# Altium footprint library IC.PcbLib: 115 footprints (part 3 of 8)
Each footprint in its own frame and in the unit in brackets; x right, y up, seen from the top. Pads: shape width x height; smd on the part's side, far side on the other; paste and mask are expansions set on the pad; w line width, h text height; cw(c..) or ccw(c..) is an arc to the next point about the centre after c.
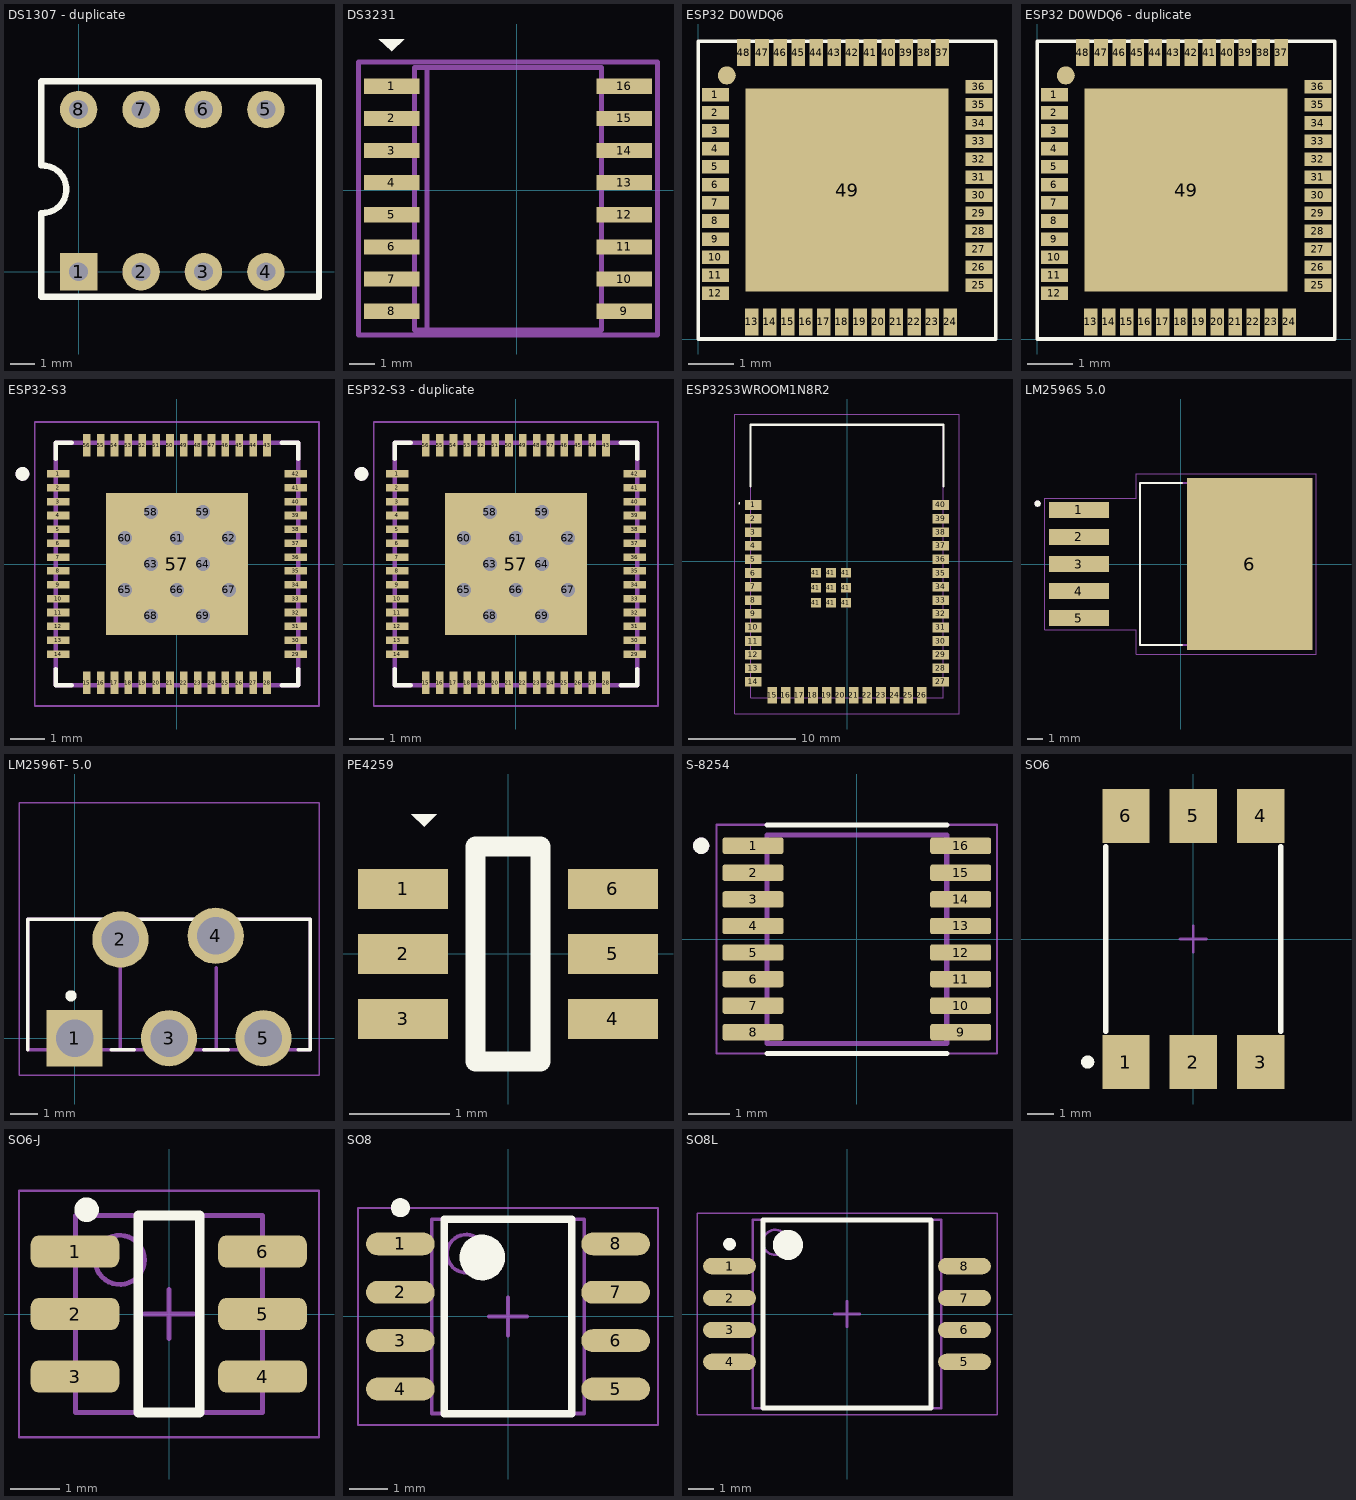
[diagram p2: the footprints below, top view; thin cyan lines are the x and y axes]

## DS1307 - duplicate [mil] "DS1307RTC"
pads (8):
  rect 60x60 hole 30: 1(0,0)
  round 60 hole 30: 2(100,0) 3(200,0) 4(300,0) 5(300,259.84) 6(200,259.84) 7(100,259.84) 8(0,259.84)
Top Overlay:
  lines w10: -60,-40 385,-40 385,305 -60,305 -60,170 cw(c-57.47,132.12) -60,94.24 -60,-40

## DS3231 [mm] "DIP16"
pads (16):
  rect 2.2x0.6 smd: 1(-4.956,4.115) 2(-4.956,2.845) 3(-4.956,1.575) 4(-4.956,0.305) 5(-4.956,-0.965) 6(-4.956,-2.235) 7(-4.956,-3.505) 8(-4.956,-4.775) 9(4.244,-4.775) 10(4.244,-3.505) 11(4.244,-2.235) 12(4.244,-0.965) 13(4.244,0.305) 14(4.244,1.575) 15(4.244,2.845) 16(4.244,4.115)
Top Overlay:
  region: -5.474,5.982 -4.458,5.982 -4.94,5.499
Mechanical 13:
  region: 3.444,3.87 3.444,4.36 4.964,4.36 4.964,3.87
  region: 3.444,2.6 3.444,3.09 4.964,3.09 4.964,2.6
  region: 3.444,1.33 3.444,1.82 4.964,1.82 4.964,1.33
  region: 3.444,0.06 3.444,0.55 4.964,0.55 4.964,0.06
  region: 3.444,-1.21 3.444,-0.72 4.964,-0.72 4.964,-1.21
  region: 3.444,-2.48 3.444,-1.99 4.964,-1.99 4.964,-2.48
  region: 3.444,-3.75 3.444,-3.26 4.964,-3.26 4.964,-3.75
  region: 3.444,-5.02 3.444,-4.53 4.964,-4.53 4.964,-5.02
  region: -5.676,-5.02 -5.676,-4.53 -4.156,-4.53 -4.156,-5.02
  region: -5.676,-3.75 -5.676,-3.26 -4.156,-3.26 -4.156,-3.75
  region: -5.676,-2.48 -5.676,-1.99 -4.156,-1.99 -4.156,-2.48
  region: -5.676,-1.21 -5.676,-0.72 -4.156,-0.72 -4.156,-1.21
  region: -5.676,0.06 -5.676,0.55 -4.156,0.55 -4.156,0.06
  region: -5.676,1.33 -5.676,1.82 -4.156,1.82 -4.156,1.33
  region: -5.676,2.6 -5.676,3.09 -4.156,3.09 -4.156,2.6
  region: -5.676,3.87 -5.676,4.36 -4.156,4.36 -4.156,3.87
  lines w0.203: -3.556,-5.52 -4.056,-5.52 -4.056,4.86 -3.556,4.86 ; -3.556,-5.52 3.344,-5.52 3.344,4.86 -3.556,4.86 ; -3.556,-5.52 -3.556,4.86
Mechanical 15:
  lines w0.2: -6.256,-5.725 5.544,-5.725 5.544,5.065 -6.256,5.065 -6.256,-5.725
3D body "step_temp.STEP": height 2.65, standoff 0, extent -5.518,-5.48 4.807,4.82

## ESP32 D0WDQ6 [mm] "ESP32 D0WDQ6"
pads (50):
  rect 0.6x0.3 smd mask+0: 1(0.381,5.416) 2(0.381,5.016) 3(0.381,4.616) 4(0.381,4.216) 5(0.381,3.816) 6(0.381,3.416) 7(0.381,3.016) 8(0.381,2.616) 9(0.381,2.216) 10(0.381,1.816) 11(0.381,1.416) 12(0.381,1.016) 25(6.223,1.188) 26(6.223,1.588) 27(6.223,1.988) 28(6.223,2.388) 29(6.223,2.788) 30(6.223,3.188) 31(6.223,3.588) 32(6.223,3.988) 33(6.223,4.388) 34(6.223,4.788) 35(6.223,5.188) 36(6.223,5.588)
  rect 0.3x0.6 smd mask+0: 13(1.188,0.381) 14(1.588,0.381) 15(1.988,0.381) 16(2.388,0.381) 17(2.788,0.381) 18(3.188,0.381) 19(3.588,0.381) 20(3.988,0.381) 21(4.388,0.381) 22(4.788,0.381) 23(5.188,0.381) 24(5.588,0.381) 37(5.416,6.35) 38(5.016,6.35) 39(4.616,6.35) 40(4.216,6.35) 41(3.816,6.35) 42(3.416,6.35) 43(3.016,6.35) 44(2.616,6.35) 45(2.216,6.35) 46(1.816,6.35) 47(1.416,6.35) 48(1.016,6.35)
  rect 4.5x4.5 smd mask+0: 49(3.302,3.302)
  round 0.4 smd mask+0: ""(0.635,5.842)
Top Overlay:
  lines w0.08: 0,0 6.6,0 6.6,6.6 0,6.6 0,0
3D body "ESP32-D0WDQ6-V3_EXP.step": height 0.89, standoff 0, extent 0.279,0.279 6.325,6.325

## ESP32 D0WDQ6 - duplicate [mm] "ESP32 D0WDQ6"
pads (50):
  rect 0.6x0.3 smd mask+0: 1(0.381,5.416) 2(0.381,5.016) 3(0.381,4.616) 4(0.381,4.216) 5(0.381,3.816) 6(0.381,3.416) 7(0.381,3.016) 8(0.381,2.616) 9(0.381,2.216) 10(0.381,1.816) 11(0.381,1.416) 12(0.381,1.016) 25(6.223,1.188) 26(6.223,1.588) 27(6.223,1.988) 28(6.223,2.388) 29(6.223,2.788) 30(6.223,3.188) 31(6.223,3.588) 32(6.223,3.988) 33(6.223,4.388) 34(6.223,4.788) 35(6.223,5.188) 36(6.223,5.588)
  rect 0.3x0.6 smd mask+0: 13(1.188,0.381) 14(1.588,0.381) 15(1.988,0.381) 16(2.388,0.381) 17(2.788,0.381) 18(3.188,0.381) 19(3.588,0.381) 20(3.988,0.381) 21(4.388,0.381) 22(4.788,0.381) 23(5.188,0.381) 24(5.588,0.381) 37(5.416,6.35) 38(5.016,6.35) 39(4.616,6.35) 40(4.216,6.35) 41(3.816,6.35) 42(3.416,6.35) 43(3.016,6.35) 44(2.616,6.35) 45(2.216,6.35) 46(1.816,6.35) 47(1.416,6.35) 48(1.016,6.35)
  rect 4.5x4.5 smd mask+0: 49(3.302,3.302)
  round 0.4 smd mask+0: ""(0.635,5.842)
Top Overlay:
  lines w0.08: 0,0 6.6,0 6.6,6.6 0,6.6 0,0
3D body "ESP32-D0WDQ6-V3_EXP.step": height 0.89, standoff 0, extent 0.279,0.279 6.325,6.325

## ESP32-S3 [mm]
height 0.9
pads (69):
  rect 0.65x0.22 smd mask+0.05: 1(-3.425,2.6) 2(-3.425,2.2) 3(-3.425,1.8) 4(-3.425,1.4) 5(-3.425,1) 6(-3.425,0.6) 7(-3.425,0.2) 8(-3.425,-0.2) 9(-3.425,-0.6) 10(-3.425,-1) 11(-3.425,-1.4) 12(-3.425,-1.8) 13(-3.425,-2.2) 14(-3.425,-2.6) 29(3.425,-2.6) 30(3.425,-2.2) 31(3.425,-1.8) 32(3.425,-1.4) 33(3.425,-1) 34(3.425,-0.6) 35(3.425,-0.2) 36(3.425,0.2) 37(3.425,0.6) 38(3.425,1) 39(3.425,1.4) 40(3.425,1.8) 41(3.425,2.2) 42(3.425,2.6)
  rect 0.22x0.65 smd mask+0.05: 15(-2.6,-3.425) 16(-2.2,-3.425) 17(-1.8,-3.425) 18(-1.4,-3.425) 19(-1,-3.425) 20(-0.6,-3.425) 21(-0.2,-3.425) 22(0.2,-3.425) 23(0.6,-3.425) 24(1,-3.425) 25(1.4,-3.425) 26(1.8,-3.425) 27(2.2,-3.425) 28(2.6,-3.425) 43(2.6,3.425) 44(2.2,3.425) 45(1.8,3.425) 46(1.4,3.425) 47(1,3.425) 48(0.6,3.425) 49(0.2,3.425) 50(-0.2,3.425) 51(-0.6,3.425) 52(-1,3.425) 53(-1.4,3.425) 54(-1.8,3.425) 55(-2.2,3.425) 56(-2.6,3.425)
  rect 4.1x4.1 smd paste-1.55: 57(0,0)
  round 0.5 hole 0.4 mask+0: 58(-0.75,1.5) 59(0.75,1.5) 60(-1.5,0.75) 61(0,0.75) 62(1.5,0.75) 63(-0.75,0) 64(0.75,0) 65(-1.5,-0.75) 66(0,-0.75) 67(1.5,-0.75) 68(-0.75,-1.5) 69(0.75,-1.5)
Top Overlay:
  circle w0.2: c-4.455,2.6 r0.1
  lines w0.127: -3.5,-3.03 -3.5,-3.5 -3.03,-3.5 ; -3.5,3.03 -3.5,3.5 -3.03,3.5 ; 3.03,-3.5 3.5,-3.5 3.5,-3.03 ; 3.03,3.5 3.5,3.5 3.5,3.03
Top Paste:
  region: -1,1 -2,1 -2,2 -1,2
  region: -1,-0.5 -2,-0.5 -2,0.5 -1,0.5
  region: -1,-2 -2,-2 -2,-1 -1,-1
  region: 0.5,-2 -0.5,-2 -0.5,-1 0.5,-1
  region: 2,-2 1,-2 1,-1 2,-1
  region: 2,-0.5 1,-0.5 1,0.5 2,0.5
  region: 2,1 1,1 1,2 2,2
  region: 0.5,1 -0.5,1 -0.5,2 0.5,2
Mechanical 13:
  circle w0.2: c-4.455,2.6 r0.1
  lines w0.127: -3.5,-3.5 -3.5,3.5 3.5,3.5 3.5,-3.5 -3.5,-3.5
Mechanical 15:
  lines w0.05: -4.1,-4.1 -4.1,4.1 4.1,4.1 4.1,-4.1 -4.1,-4.1
3D body "step_temp.STEP": height 0.9, standoff 0, extent -3.5,-3.5 3.5,3.5

## ESP32-S3 - duplicate [mm]
height 0.9
pads (69):
  rect 0.65x0.22 smd mask+0.05: 1(-3.425,2.6) 2(-3.425,2.2) 3(-3.425,1.8) 4(-3.425,1.4) 5(-3.425,1) 6(-3.425,0.6) 7(-3.425,0.2) 8(-3.425,-0.2) 9(-3.425,-0.6) 10(-3.425,-1) 11(-3.425,-1.4) 12(-3.425,-1.8) 13(-3.425,-2.2) 14(-3.425,-2.6) 29(3.425,-2.6) 30(3.425,-2.2) 31(3.425,-1.8) 32(3.425,-1.4) 33(3.425,-1) 34(3.425,-0.6) 35(3.425,-0.2) 36(3.425,0.2) 37(3.425,0.6) 38(3.425,1) 39(3.425,1.4) 40(3.425,1.8) 41(3.425,2.2) 42(3.425,2.6)
  rect 0.22x0.65 smd mask+0.05: 15(-2.6,-3.425) 16(-2.2,-3.425) 17(-1.8,-3.425) 18(-1.4,-3.425) 19(-1,-3.425) 20(-0.6,-3.425) 21(-0.2,-3.425) 22(0.2,-3.425) 23(0.6,-3.425) 24(1,-3.425) 25(1.4,-3.425) 26(1.8,-3.425) 27(2.2,-3.425) 28(2.6,-3.425) 43(2.6,3.425) 44(2.2,3.425) 45(1.8,3.425) 46(1.4,3.425) 47(1,3.425) 48(0.6,3.425) 49(0.2,3.425) 50(-0.2,3.425) 51(-0.6,3.425) 52(-1,3.425) 53(-1.4,3.425) 54(-1.8,3.425) 55(-2.2,3.425) 56(-2.6,3.425)
  rect 4.1x4.1 smd paste-1.55: 57(0,0)
  round 0.5 hole 0.4 mask+0: 58(-0.75,1.5) 59(0.75,1.5) 60(-1.5,0.75) 61(0,0.75) 62(1.5,0.75) 63(-0.75,0) 64(0.75,0) 65(-1.5,-0.75) 66(0,-0.75) 67(1.5,-0.75) 68(-0.75,-1.5) 69(0.75,-1.5)
Top Overlay:
  circle w0.2: c-4.455,2.6 r0.1
  lines w0.127: -3.5,-3.03 -3.5,-3.5 -3.03,-3.5 ; -3.5,3.03 -3.5,3.5 -3.03,3.5 ; 3.03,-3.5 3.5,-3.5 3.5,-3.03 ; 3.03,3.5 3.5,3.5 3.5,3.03
Top Paste:
  region: 0.5,1 -0.5,1 -0.5,2 0.5,2
  region: 2,1 1,1 1,2 2,2
  region: 2,-0.5 1,-0.5 1,0.5 2,0.5
  region: 2,-2 1,-2 1,-1 2,-1
  region: 0.5,-2 -0.5,-2 -0.5,-1 0.5,-1
  region: -1,-2 -2,-2 -2,-1 -1,-1
  region: -1,-0.5 -2,-0.5 -2,0.5 -1,0.5
  region: -1,1 -2,1 -2,2 -1,2
Mechanical 13:
  circle w0.2: c-4.455,2.6 r0.1
  lines w0.127: -3.5,-3.5 3.5,-3.5 3.5,3.5 -3.5,3.5 -3.5,-3.5
Mechanical 15:
  lines w0.05: -4.1,-4.1 4.1,-4.1 4.1,4.1 -4.1,4.1 -4.1,-4.1
3D body "step_temp.STEP": height 0.9, standoff 0, extent -3.5,-3.5 3.5,3.5

## ESP32S3WROOM1N8R2 [mm]
pads (49):
  rect 1.5x0.9 smd: 1(-8.75,5.26) 2(-8.75,3.99) 3(-8.75,2.72) 4(-8.75,1.45) 5(-8.75,0.18) 6(-8.75,-1.09) 7(-8.75,-2.36) 8(-8.75,-3.63) 9(-8.75,-4.9) 10(-8.75,-6.17) 11(-8.75,-7.44) 12(-8.75,-8.71) 13(-8.75,-9.98) 14(-8.75,-11.25) 27(8.75,-11.25) 28(8.75,-9.98) 29(8.75,-8.71) 30(8.75,-7.44) 31(8.75,-6.17) 32(8.75,-4.9) 33(8.75,-3.63) 34(8.75,-2.36) 35(8.75,-1.09) 36(8.75,0.18) 37(8.75,1.45) 38(8.75,2.72) 39(8.75,3.99) 40(8.75,5.26)
  rect 0.9x1.5 smd: 15(-6.985,-12.5) 16(-5.715,-12.5) 17(-4.445,-12.5) 18(-3.175,-12.5) 19(-1.905,-12.5) 20(-0.635,-12.5) 21(0.635,-12.5) 22(1.905,-12.5) 23(3.175,-12.5) 24(4.445,-12.5) 25(5.715,-12.5) 26(6.985,-12.5)
  rect 0.9x0.9 smd: 41(-2.9,-3.86) 41(-2.9,-2.46) 41(-2.9,-1.06) 41(-1.5,-3.86) 41(-1.5,-2.46) 41(-1.5,-1.06) 41(-0.1,-3.86) 41(-0.1,-2.46) 41(-0.1,-1.06)
Top Overlay:
  lines w0.1: -10.1,5.4 ccw(c-10.05,5.4) -10,5.4 ccw(c-10.05,5.4) -10.1,5.4
  lines w0.2: -9,7 -9,12.75 9,12.75 9,7
Mechanical 13:
  lines w0.1: -10.5,-14.25 -10.5,13.75 10.5,13.75 10.5,-14.25 -10.5,-14.25 ; -9,-12.75 -9,12.75 9,12.75 9,-12.75 -9,-12.75
3D body "step_temp.STEP": height 3.25, standoff 0, extent -9,-12.75 9,12.75

## LM2596S 5.0 [mm]
height 4.83
pads (6):
  rect 3.79x0.99 smd: 1(-6.4,3.4) 2(-6.4,1.7) 3(-6.4,0) 4(-6.4,-1.7) 5(-6.4,-3.4)
  rect 7.88x10.84 smd paste-6: 6(4.35,0)
Top Overlay:
  circle w0.2: c-9,3.8 r0.1
  lines w0.127: 0.09,-5.08 -2.553,-5.08 -2.553,5.08 0.09,5.08
Top Paste:
  region: 7.74,-5.15 6.22,-5.15 6.22,-3.9 7.74,-3.9
  region: 2.48,-5.15 0.96,-5.15 0.96,-3.9 2.48,-3.9
  region: 5.11,-5.15 3.59,-5.15 3.59,-3.9 5.11,-3.9
  region: 7.74,-3.34 6.22,-3.34 6.22,-2.09 7.74,-2.09
  region: 2.48,-3.34 0.96,-3.34 0.96,-2.09 2.48,-2.09
  region: 5.11,-3.34 3.59,-3.34 3.59,-2.09 5.11,-2.09
  region: 7.74,-1.53 6.22,-1.53 6.22,-0.28 7.74,-0.28
  region: 2.48,-1.53 0.96,-1.53 0.96,-0.28 2.48,-0.28
  region: 5.11,-1.53 3.59,-1.53 3.59,-0.28 5.11,-0.28
  region: 7.74,3.9 6.22,3.9 6.22,5.15 7.74,5.15
  region: 2.48,3.9 0.96,3.9 0.96,5.15 2.48,5.15
  region: 5.11,3.9 3.59,3.9 3.59,5.15 5.11,5.15
  region: 7.74,2.09 6.22,2.09 6.22,3.34 7.74,3.34
  region: 2.48,2.09 0.96,2.09 0.96,3.34 2.48,3.34
  region: 5.11,2.09 3.59,2.09 3.59,3.34 5.11,3.34
  region: 7.74,0.28 6.22,0.28 6.22,1.53 7.74,1.53
  region: 2.48,0.28 0.96,0.28 0.96,1.53 2.48,1.53
  region: 5.11,0.28 3.59,0.28 3.59,1.53 5.11,1.53
Mechanical 13:
  circle w0.2: c-9,3.8 r0.1
  lines w0.127: -2.553,-5.08 -2.553,5.08 6.368,5.08 6.368,-5.08 -2.553,-5.08
Mechanical 15:
  lines w0.05: -8.545,-4.145 -2.803,-4.145 -2.803,-5.67 8.54,-5.67 8.54,5.67 -2.803,5.67 -2.803,4.145 -8.545,4.145 -8.545,-4.145
3D body "step_temp.STEP": height 4.65, standoff -0.15, extent -7.175,-5.08 7.175,5.08

## LM2596T- 5.0 [mm] "SIMPLE SWITCHER® 4.5V to 40V, 3A Low Component Count Step-Down Regulator 5-TO-220"
pads (5):
  rect 2.025x2.025 / inner round 2.025 / far side rect 2.025x2.025 hole 1.35: 1(0,0)
  round 2.025 hole 1.35: 2(1.651,3.556) 3(3.4,0) 4(5.08,3.683) 5(6.8,0)
Top Overlay:
  circle w0.2: c-0.127,1.524 r0.1
  lines w0.127: -1.68,-0.42 -1.68,4.28 8.48,4.28 8.48,-0.42 8.06,-0.42 ; 1.329,-0.42 2.14,-0.42 ; 4.66,-0.42 5.54,-0.42
Mechanical 13:
  lines w0.127: 1.651,2.54 1.651,-0.42 5.1,-0.42 ; 1.7,-0.42 -1.68,-0.42 -1.68,4.28 8.48,4.28 8.48,-0.42 5.1,-0.42 ; 5.1,2.54 5.1,-0.42
Mechanical 15:
  lines w0.05: -2,-1.331 8.8,-1.331 8.8,8.47 -2,8.47 -2,-1.331
3D body "step_temp.STEP": height 20.93, standoff -3.78, extent -1.778,-0.089 8.382,8.382

## PCBComponent_1 [mm]

## PE4259 [mm] "RF Switch"
pads (6):
  rect 0.9x0.4 smd: 1(-1.05,0.65) 2(-1.05,0) 3(-1.05,-0.65) 4(1.05,-0.65) 5(1.05,0) 6(1.05,0.65)
Top Overlay:
  region: -0.965,1.397 -0.711,1.397 -0.838,1.27
  lines w0.2: -0.325,-1.075 0.325,-1.075 0.325,1.075 -0.325,1.075 -0.325,-1.075
3D body "PE4259.STEP": height 1.1, standoff 0, extent -1.05,-1.05 1.05,1.05

## S-8254 [mm]
height 1.1
pads (16):
  rrect25% 1.49x0.4 smd: 1(-2.54,2.286) 2(-2.54,1.625) 3(-2.54,0.975) 4(-2.54,0.325) 5(-2.54,-0.325) 6(-2.54,-0.975) 7(-2.54,-1.625) 8(-2.54,-2.275) 9(2.54,-2.275) 10(2.54,-1.625) 11(2.54,-0.975) 12(2.54,-0.325) 13(2.54,0.325) 14(2.54,0.975) 15(2.54,1.625) 16(2.54,2.286)
Top Overlay:
  circle w0.2: c-3.81,2.286 r0.1
  lines w0.127: -2.2,-2.795 2.2,-2.795 ; -2.2,2.795 2.2,2.795
Mechanical 13:
  circle w0.2: c-3.81,2.286 r0.1
  lines w0.127: -2.2,-2.55 -2.2,2.55 2.2,2.55 2.2,-2.55 -2.2,-2.55
Mechanical 15:
  lines w0.05: -3.429,-2.8 -3.429,2.8 3.429,2.8 3.429,-2.8 -3.429,-2.8
3D body "step_temp.STEP": height 1.1, standoff 0, extent -3.2,-2.55 3.2,2.55

## SO6 [mil]
height 200
pads (6):
  rect 70x80 smd: 1(-100,-182.48) 2(0,-182.48) 3(100,-182.48) 5(0,182.48) 6(-100,182.48)
  rect 70x80 smd mask+0: 4(100,182.48)
Top Overlay:
  circle w9.84: c-156.69,-182.48 r4.92
  lines w7.87: -129.92,-136.81 -129.92,136.81 ; 129.92,-136.81 129.92,136.81
Mechanical 15:
  lines w3.94: -19.69,0 19.68,0 ; 0,-19.68 0,19.68
3D body "PC900.stp": height 140.63, standoff 0.14, extent -138.06,-212.03 138.5,211.43

## SO6-J [mm] "SOJ, 6-Leads, Body 4.00x4.30mm, Pitch 1.27mm, IPC Low Density"
height 1.1
pads (6):
  rrect50% 1.8x0.65 smd: 1(-1.91,1.27) 2(-1.91,0) 3(-1.91,-1.27) 4(1.9,-1.27) 5(1.9,0) 6(1.9,1.27)
Top Overlay:
  circle w0.25: c-1.675,2.12 r0.125
  lines w0.2: -0.625,-2 0.625,-2 0.625,2 -0.625,2 -0.625,-2
Mechanical 13:
  circle w0.1: c-1,1.1 r0.5
  lines w0.1: -1.9,-2 1.9,-2 1.9,2 -1.9,2 -1.9,-2
Mechanical 15:
  lines w0.05: -3.048,-2.5 3.048,-2.5 3.048,2.5 -3.048,2.5 -3.048,-2.5
  lines w0.1: -0.5,0 0.5,0 ; 0,-0.5 0,0.5
3D body "SOIC127P490X150-6N.step": height 1.5, standoff 0, extent -2.45,-2 2.45,2

## SO8 [mm] "SOIC, 8-Leads, Body 4.9x3.9mm, Pitch 1.27mm, IPC High Density"
pads (8):
  oval 1.8x0.6 smd: 1(-2.825,1.905) 2(-2.825,0.635) 3(-2.825,-0.635) 4(-2.825,-1.905) 5(2.825,-1.905) 6(2.825,-0.635) 7(2.825,0.635) 8(2.825,1.905)
Top Overlay:
  circle w0.6: c-0.675,1.55 r0.3
  circle w0.25: c-2.825,2.855 r0.125
  lines w0.2: -1.675,-2.55 1.675,-2.55 1.675,2.55 -1.675,2.55 -1.675,-2.55
Mechanical 13:
  circle w0.1: c-1.1,1.65 r0.5
  lines w0.1: -2,-2.55 2,-2.55 2,2.55 -2,2.55 -2,-2.55
Mechanical 15:
  lines w0.05: -3.937,-2.85 3.937,-2.85 3.937,2.85 -3.937,2.85 -3.937,-2.85
  lines w0.1: -0.5,0 0.5,0 ; 0,-0.5 0,0.5
3D body "CircuitWorks-SO-8 (PIC12FXXX).step": height 1.6, standoff 0, extent -2.995,-2.45 2.995,2.45

## SO8L [mm] "SOIC, 8-Leads, Body 7.50x7.50mm, Pitch 1.27mm, IPC Medium Density"
height 1.5
pads (8):
  oval 2.1x0.65 smd: 1(-4.675,1.905) 2(-4.675,0.635) 3(-4.675,-0.635) 4(-4.675,-1.905) 5(4.675,-1.905) 6(4.675,-0.635) 7(4.675,0.635) 8(4.675,1.905)
Top Overlay:
  circle w0.6: c-2.35,2.75 r0.3
  circle w0.25: c-4.675,2.78 r0.125
  lines w0.2: -3.35,-3.75 3.35,-3.75 3.35,3.75 -3.35,3.75 -3.35,-3.75
Mechanical 13:
  circle w0.1: c-2.85,2.85 r0.5
  lines w0.1: -3.75,-3.75 3.75,-3.75 3.75,3.75 -3.75,3.75 -3.75,-3.75
Mechanical 15:
  lines w0.05: -5.969,-4 5.969,-4 5.969,4 -5.969,4 -5.969,-4
  lines w0.1: -0.5,0 0.5,0 ; 0,-0.5 0,0.5
3D body "SOIC127P1000X150-8N.step": height 1.5, standoff 0, extent -5,-3.65 5,3.65